# Altium footprint library CMRat_GEN2.8.PcbLib: 50 footprints (part 2 of 4)
Each footprint in its own frame and in the unit in brackets; x right, y up, seen from the top. Pads: shape width x height; smd on the part's side, far side on the other; paste and mask are expansions set on the pad; w line width, h text height; cw(c..) or ccw(c..) is an arc to the next point about the centre after c.
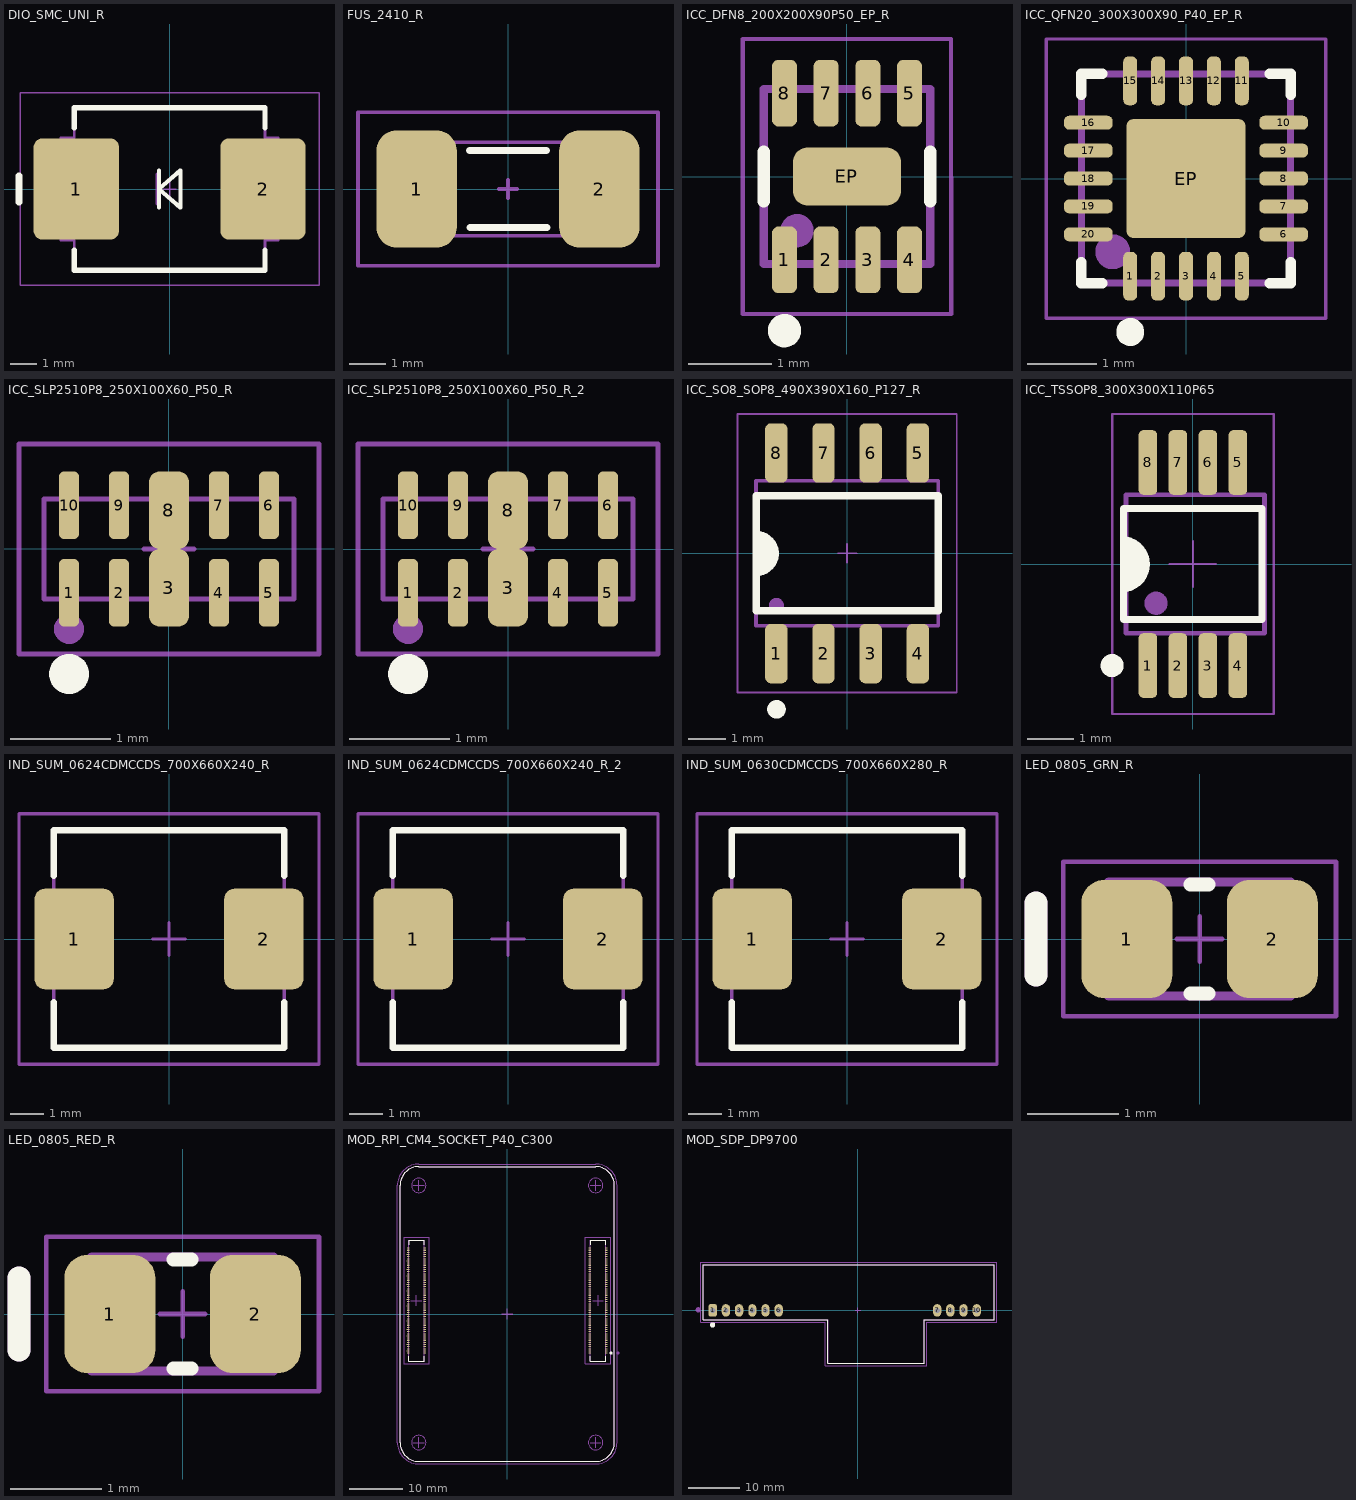
[diagram p1: the footprints below, top view; thin cyan lines are the x and y axes]

## DIO_SMC_UNI_R [mm]
pads (2):
  rrect20% 3.2x3.8 smd: 1(-3.5,0) 2(3.5,0)
Top Overlay:
  lines w0.152: -0.4,-0.7 -0.4,0.7 ; -0.4,0 0.4,0.7 0.4,-0.7 -0.4,0
  lines w0.2: -3.575,-2.3 -3.575,-3.05 3.575,-3.05 3.575,-2.3 ; -3.575,2.3 -3.575,3.05 3.575,3.05 3.575,2.3
  lines w0.25: -5.65,-0.5 -5.65,0.5
Mechanical 19:
  lines w0.1: 0.525,3.05 3.575,3.05 3.575,1.925 4.075,1.925 4.075,-0.525 4.075,-1.925 3.575,-1.925 3.575,-3.05 1.6,-3.05 ; 0.575,3.05 -3.575,3.05 -3.575,1.925 -4.075,1.925 -4.075,0.525 -4.075,-1.925 -3.575,-1.925 -3.575,-3.05 1.95,-3.05 ; -0.45,0 0.4,-0.7 0.4,0.7 -0.45,0
  lines w0.152: -0.45,-0.55 -0.45,0.55
  lines w0.25: -4.6,-0.5 -4.6,0.5
  text ".Designator" at 1.9,-1.15 h2
Mechanical 23:
  lines w0.05: -0.25,0 0.25,0 ; 0,-0.25 0,0.25 ; -5.6,-3.6 -4.35,-3.6 4.35,-3.6 5.6,-3.6 5.6,3.6 4.35,3.6 -4.35,3.6 -5.6,3.6 -5.6,-3.6
3D body "[SMC]User Library-DIOM8261X24.STEP": height 2.4, standoff 0.03, extent -4.065,-3.05 4.065,3.05

## FUS_2410_R [mm]
height 2.4
pads (2):
  rrect50% 2.2x3.2 smd: 1(-2.5,0) 2(2.5,0)
Top Overlay:
  lines w0.2: -1.05,1.05 1.05,1.05 ; -1.039,-1.05 1.061,-1.05
Mechanical 19:
  lines w0.1: -3.05,-1.275 -3.05,1.275 3.05,1.275 3.05,-1.275 -3.05,-1.275
  text ".Designator" at 1.65,0.3 h1
Mechanical 23:
  lines w0.1: -0.25,0 0.25,0 ; 0,-0.25 0,0.25 ; -4.1,-2.1 4.1,-2.1 4.1,2.1 -4.1,2.1 -4.1,-2.1
3D body "Fuse-2410.step": height 2.54, standoff 0, extent -3.05,-1.27 3.05,1.27

## ICC_DFN8_200X200X90P50_EP_R [mm]
height 0.9
pads (9):
  rrect50% 0.3x0.8 smd: 1(-0.75,-1) 2(-0.25,-1) 3(0.25,-1) 4(0.75,-1) 5(0.75,1) 6(0.25,1) 7(-0.25,1) 8(-0.75,1)
  rrect50% 1.3x0.7 smd: EP(0,0)
Top Overlay:
  circle w0.2: c-0.75,-1.85 r0.1
  lines w0.15: -1,-0.3 -1,0.3 ; 1,-0.3 1,0.3
Mechanical 19:
  circle w0.2: c-0.6,-0.65 r0.1
  lines w0.1: -1,-1.05 -1,1.05 1,1.05 1,-1.05 -1,-1.05
  text ".Designator" at -1.3,-1.25 h1.2
Mechanical 23:
  lines w0.05: -0.25,0 0.25,0 ; 0,-0.25 0,0.25 ; -1.25,-1.65 -1.25,1.65 1.25,1.65 1.25,-1.65 -1.25,-1.65
3D body "MIC2290YML_TR.stp": height 0.95, standoff 0, extent -1,-1.05 1,1.05

## ICC_QFN20_300X300X90_P40_EP_R [mm]
height 13.25
pads (21):
  rrect75% 0.2x0.7 smd: 1(-0.8,-1.4) 2(-0.4,-1.4) 3(0,-1.4) 4(0.4,-1.4) 5(0.8,-1.4) 11(0.8,1.4) 12(0.4,1.4) 13(0,1.4) 14(-0.4,1.4) 15(-0.8,1.4)
  rrect75% 0.7x0.2 smd: 6(1.4,-0.8) 7(1.4,-0.4) 8(1.4,0) 9(1.4,0.4) 10(1.4,0.8) 16(-1.4,0.8) 17(-1.4,0.4) 18(-1.4,0) 19(-1.4,-0.4) 20(-1.4,-0.8)
  rrect10% 1.7x1.7 smd paste-10: EP(0,0)
Top Overlay:
  circle w0.2: c-0.8,-2.2 r0.1
  lines w0.15: -1.5,-1.2 -1.5,-1.5 -1.2,-1.5 ; -1.5,1.2 -1.5,1.5 -1.2,1.5 ; 1.2,-1.5 1.5,-1.5 1.5,-1.2 ; 1.2,1.5 1.5,1.5 1.5,1.2
Top Paste:
  circle w0.3: c0,0 r0.125
  circle w0.3: c0.55,-0.55 r0.125
  circle w0.3: c0.55,0.55 r0.125
  circle w0.3: c-0.55,0.55 r0.125
  circle w0.3: c-0.55,-0.55 r0.125
Mechanical 19:
  circle w0.25: c-1.05,-1.05 r0.125
  lines w0.1: -1.5,-1.5 -1.5,1.5 1.5,1.5 1.5,-1.5 -1.5,-1.5
  text ".Designator" at -2,-0.9 h1
Mechanical 23:
  lines w0.05: -0.4,0 0.4,0 ; 0,-0.41 0,0.39 ; -2,-2 -2,2 2,2 2,-2 -2,-2
3D body "VQFN-20-3x3mm.step": height 0.85, standoff 0, extent -1.5,-1.5 1.5,1.5

## ICC_SLP2510P8_250X100X60_P50_R [mm]
height 4.5
pads (10):
  rrect50% 0.2x0.675 smd: 1(-1,-0.438) 2(-0.5,-0.438) 4(0.5,-0.437) 5(1,-0.437) 6(1,0.437) 7(0.5,0.437) 9(-0.5,0.437) 10(-1,0.437)
  rrect50% 0.4x0.775 smd: 3(0,-0.388) 8(0,0.387)
Top Overlay:
  circle w0.2: c-1,-1.25 r0.1
Mechanical 19:
  circle w0.15: c-1,-0.8 r0.075
  lines w0.05: -1.25,-0.5 -1.25,0.5 1.25,0.5 1.25,-0.5 -1.25,-0.5
  text ".Designator" at -1.6,-1.15 h1
Mechanical 23:
  lines w0.05: -0.25,0 0.25,0 ; 0,-0.25 0,0.25 ; -1.5,-1.05 -1.5,1.05 1.5,1.05 1.5,-1.05 -1.5,-1.05
3D body "SLP2510P8.step": height 0.56, standoff -0.03, extent -1.25,-0.505 1.25,0.505

## ICC_SLP2510P8_250X100X60_P50_R_2 [mm]
pads (10):
  rrect50% 0.2x0.675 smd: 1(-1,-0.437) 2(-0.5,-0.437) 4(0.5,-0.437) 5(1,-0.437) 6(1,0.438) 7(0.5,0.438) 9(-0.5,0.438) 10(-1,0.438)
  rrect50% 0.4x0.775 smd: 3(0,-0.387) 8(0,0.388)
Top Overlay:
  circle w0.2: c-1,-1.25 r0.1
Mechanical 19:
  circle w0.15: c-1,-0.8 r0.075
  lines w0.05: -1.25,-0.5 1.25,-0.5 1.25,0.5 -1.25,0.5 -1.25,-0.5
  text ".Designator" at 1,1.65 h1
Mechanical 23:
  lines w0.05: -0.25,0 0.25,0 ; 0,-0.25 0,0.25 ; -1.5,-1.05 1.5,-1.05 1.5,1.05 -1.5,1.05 -1.5,-1.05
3D body "SLP2510P8.step": height 0.56, standoff -0.03, extent -1.25,-0.505 1.25,0.505

## ICC_SO8_SOP8_490X390X160_P127_R [mm]
height 10.7
pads (8):
  rrect50% 0.6x1.6 smd: 1(-1.905,-2.7) 2(-0.635,-2.7) 3(0.635,-2.7) 4(1.905,-2.7) 5(1.905,2.7) 6(0.635,2.7) 7(-0.635,2.7) 8(-1.905,2.7)
Top Overlay:
  circle w0.25: c-1.9,-4.2 r0.125
  region: -2.025,-0.3 -2.025,0.29 -2.178,0.29 -2.178,-0.3
  region: -2.136,-0.456 -2.136,0.44 -2.396,0.44 -2.396,-0.456
  lines w0.2: -2.45,-1.55 2.45,-1.55 2.45,1.55 -2.45,1.55 -2.45,-1.55
  lines w0.203: -2.447,-0.513 ccw(c-2.447,-0.005) -2.447,0.503
Mechanical 19:
  circle w0.2: c-1.9,-1.4 r0.1
  lines w0.1: -2.115,-1.95 -2.115,-3 -1.695,-3 -1.695,-1.95 ; -2.115,1.95 -2.115,3 -1.695,3 -1.695,1.95 ; -0.845,-1.95 -0.845,-3 -0.425,-3 -0.425,-1.95 ; -0.845,1.95 -0.845,3 -0.425,3 -0.425,1.95 ; 0.425,-1.95 0.425,-3 0.845,-3 0.845,-1.95 ; 0.425,1.95 0.425,3 0.845,3 0.845,1.95 ; 1.695,-1.95 1.695,-3 2.115,-3 2.115,-1.95 ; 1.695,1.95 1.695,3 2.115,3 2.115,1.95 ; -2.45,-1.95 -2.45,1.95 2.45,1.95 2.45,-1.95 -2.45,-1.95
  text ".Designator" at 2,0.65 h2
Mechanical 23:
  lines w0.05: -0.25,0 0.25,0 ; 0,-0.25 0,0.25 ; -2.95,-3.75 -2.95,3.75 2.95,3.75 2.95,-3.75 -2.95,-3.75
3D body "SOIC-8-1.step": height 1.75, standoff 0, extent -2.45,-3 2.45,3

## ICC_TSSOP8_300X300X110P65 [mm] "TSOP, 8-pin, Body 3.00x3.00mm, Pitch 0.65mm"
height 1.1
pads (8):
  rrect50% 0.4x1.4 smd: 1(-0.975,-2.2) 2(-0.325,-2.2) 3(0.325,-2.2) 4(0.975,-2.2) 5(0.975,2.2) 6(0.325,2.2) 7(-0.325,2.2) 8(-0.975,2.2)
Top Overlay:
  circle w0.25: c-1.75,-2.2 r0.125
  region: -1.235,-0.442 -1.235,0.454 -1.495,0.454 -1.495,-0.442
  region: -1.12,-0.3 -1.12,0.29 -1.272,0.29 -1.272,-0.3
  lines w0.15: -1.5,-1.2 1.5,-1.2 1.5,1.2 -1.5,1.2 -1.5,-1.2
  lines w0.203: -1.45,0.494 cw(c-1.542,-0.005) -1.445,-0.504
Mechanical 19:
  circle w0.25: c-0.8,-0.85 r0.125
  lines w0.05: -1.125,-1.5 -1.125,-2.45 -0.825,-2.45 -0.825,-1.5 ; -1.125,1.5 -1.125,2.45 -0.825,2.45 -0.825,1.5 ; -0.475,-1.5 -0.475,-2.45 -0.175,-2.45 -0.175,-1.5 ; -0.475,1.5 -0.475,2.45 -0.175,2.45 -0.175,1.5 ; 0.175,-1.5 0.175,-2.45 0.475,-2.45 0.475,-1.5 ; 0.175,1.5 0.175,2.45 0.475,2.45 0.475,1.5 ; 0.825,-1.5 0.825,-2.45 1.125,-2.45 1.125,-1.5 ; 0.825,1.5 0.825,2.45 1.125,2.45 1.125,1.5
  lines w0.1: -1.45,-1.5 1.55,-1.5 1.55,1.5 -1.45,1.5 -1.45,-1.5
  text ".Designator" at -2.4,0.9 h1
Mechanical 23:
  lines w0.05: -0.5,0 0.5,0 ; 0,-0.5 0,0.5 ; -1.75,-3.25 1.75,-3.25 1.75,3.25 -1.75,3.25 -1.75,-3.25
3D body "TSOP65P490X110-8N3.step": height 1.1, standoff 0, extent -1.5,-2.45 1.5,2.45

## IND_SUM_0624CDMCCDS_700X660X240_R [mm] "Molded Inductor, 2-Leads, Body 7,00x6,60mm, IPC Medium Density"
height 2.4
pads (2):
  rrect25% 2.4x3.05 smd: 1(-2.875,0) 2(2.875,0)
Top Overlay:
  lines w0.2: -3.5,-1.925 -3.5,-3.3 3.5,-3.3 3.5,-1.925 ; -3.5,1.925 -3.5,3.3 3.5,3.3 3.5,1.925
Mechanical 19:
  lines w0.1: -3.5,-3.3 3.5,-3.3 3.5,3.3 -3.5,3.3 -3.5,-3.3
  text ".Designator" at -4.45,-2.55 h3
Mechanical 23:
  lines w0.1: -0.5,0 0.5,0 ; 0,-0.5 0,0.5 ; -4.55,-3.8 4.55,-3.8 4.55,3.8 -4.55,3.8 -4.55,-3.8
3D body "INDM7066X24N.step": height 2.4, standoff 0, extent -3.72,-3.3 3.72,3.3

## IND_SUM_0624CDMCCDS_700X660X240_R_2 [mm]
pads (2):
  rrect25% 2.4x3.05 smd: 1(-2.875,0) 2(2.875,0)
Top Overlay:
  lines w0.2: -3.5,-1.925 -3.5,-3.3 3.5,-3.3 3.5,-1.925 ; -3.5,1.925 -3.5,3.3 3.5,3.3 3.5,1.925
Mechanical 19:
  lines w0.1: -3.5,-3.3 -3.5,3.3 3.5,3.3 3.5,-3.3 -3.5,-3.3
  text ".Designator" at 0.525,-1.85 h2
Mechanical 23:
  lines w0.1: -0.5,0 0.5,0 ; 0,-0.5 0,0.5 ; -4.55,-3.8 -4.55,3.8 4.55,3.8 4.55,-3.8 -4.55,-3.8
3D body "INDM7066X24N.step": height 2.4, standoff 0, extent -3.72,-3.3 3.72,3.3

## IND_SUM_0630CDMCCDS_700X660X280_R [mm] "Molded Inductor, 2-Leads, Body 7,00x6,60mm, IPC Medium Density"
height 2.8
pads (2):
  rrect25% 2.4x3.05 smd: 1(-2.875,0) 2(2.875,0)
Top Overlay:
  lines w0.2: -3.5,-1.925 -3.5,-3.3 3.5,-3.3 3.5,-1.925 ; -3.5,1.925 -3.5,3.3 3.5,3.3 3.5,1.925
Mechanical 19:
  lines w0.1: -3.5,-3.3 3.5,-3.3 3.5,3.3 -3.5,3.3 -3.5,-3.3
  text ".Designator" at 0.5,-1.8 h2
Mechanical 23:
  lines w0.1: -0.5,0 0.5,0 ; 0,-0.5 0,0.5 ; -4.55,-3.8 4.55,-3.8 4.55,3.8 -4.55,3.8 -4.55,-3.8
3D body "0630CDMCCDS.stp": height 3, standoff 0, extent -3.5,-3.3 3.5,3.3

## LED_0805_GRN_R [mm]
pads (2):
  rrect50% 1x1.3 smd: 1(-0.8,0) 2(0.8,0)
Top Overlay:
  lines w0.15: -0.1,-0.6 0.1,-0.6 ; -0.1,0.6 0.1,0.6
  lines w0.25: -1.8,-0.4 -1.8,0.4
Mechanical 19:
  lines w0.1: -1,-0.625 1,-0.625 1,0.625 -1,0.625 -1,-0.625
  lines w0.25: -1.8,-0.4 -1.8,0.4
  text ".Designator" at 4.45,0.25 h1
Mechanical 23:
  lines w0.05: -0.25,0 0.25,0 ; 0,-0.25 0,0.25 ; -1.5,-0.85 1.5,-0.85 1.5,0.85 -1.5,0.85 -1.5,-0.85
3D body "User Library-led_0805G.stp": height 1.1, standoff 0, extent -1.01,-0.625 1.01,0.625

## LED_0805_RED_R [mm]
pads (2):
  rrect50% 1x1.3 smd: 1(-0.8,0) 2(0.8,0)
Top Overlay:
  lines w0.15: -0.1,-0.6 0.1,-0.6 ; -0.1,0.6 0.1,0.6
  lines w0.25: -1.8,-0.4 -1.8,0.4
Mechanical 19:
  lines w0.1: -1,-0.625 1,-0.625 1,0.625 -1,0.625 -1,-0.625
  lines w0.25: -1.8,-0.4 -1.8,0.4
  text ".Designator" at 4.5,0.35 h1
Mechanical 23:
  lines w0.05: -0.25,0 0.25,0 ; 0,-0.25 0,0.25 ; -1.5,-0.85 1.5,-0.85 1.5,0.85 -1.5,0.85 -1.5,-0.85
3D body "User Library-led_0805.step": height 1.1, standoff 0, extent -1.01,-0.625 1.01,0.625

## MOD_RPI_CM4_3D_C300_A1 [mm]
height 7
3D body "cm4-rev1-3_new.STEP": height 6.65, standoff 1.87, extent -20,-27.5 20,27.5

## MOD_RPI_CM4_SOCKET_P40_C300 [mm]
pads (200):
  rrect75% 0.5x0.2 smd: 1(18.5,-7.3) 2(15.42,-7.3) 3(18.5,-6.9) 4(15.42,-6.9) 5(18.5,-6.5) 6(15.42,-6.5) 7(18.5,-6.1) 8(15.42,-6.1) 9(18.5,-5.7) 10(15.42,-5.7) 11(18.5,-5.3) 12(15.42,-5.3) 13(18.5,-4.9) 14(15.42,-4.9) 15(18.5,-4.5) 16(15.42,-4.5) 17(18.5,-4.1) 18(15.42,-4.1) 19(18.5,-3.7) 20(15.42,-3.7) 21(18.5,-3.3) 22(15.42,-3.3) 23(18.5,-2.9) 24(15.42,-2.9) 25(18.5,-2.5) 26(15.42,-2.5) 27(18.5,-2.1) 28(15.42,-2.1) 29(18.5,-1.7) 30(15.42,-1.7) 31(18.5,-1.3) 32(15.42,-1.3) 33(18.5,-0.9) 34(15.42,-0.9) 35(18.5,-0.5) 36(15.42,-0.5) 37(18.5,-0.1) 38(15.42,-0.1) 39(18.5,0.3) 40(15.42,0.3) 41(18.5,0.7) 42(15.42,0.7) 43(18.5,1.1) 44(15.42,1.1) 45(18.5,1.5) 46(15.42,1.5) 47(18.5,1.9) 48(15.42,1.9) 49(18.5,2.3) 50(15.42,2.3) 51(18.5,2.7) 52(15.42,2.7) 53(18.5,3.1) 54(15.42,3.1) 55(18.5,3.5) 56(15.42,3.5) 57(18.5,3.9) 58(15.42,3.9) 59(18.5,4.3) 60(15.42,4.3) 61(18.5,4.7) 62(15.42,4.7) 63(18.5,5.1) 64(15.42,5.1) 65(18.5,5.5) 66(15.42,5.5) 67(18.5,5.9) 68(15.42,5.9) 69(18.5,6.3) 70(15.42,6.3) 71(18.5,6.7) 72(15.42,6.7) 73(18.5,7.1) 74(15.42,7.1) 75(18.5,7.5) 76(15.42,7.5) 77(18.5,7.9) 78(15.42,7.9) 79(18.5,8.3) 80(15.42,8.3) 81(18.5,8.7) 82(15.42,8.7) 83(18.5,9.1) 84(15.42,9.1) 85(18.5,9.5) 86(15.42,9.5) 87(18.5,9.9) 88(15.42,9.9) 89(18.5,10.3) 90(15.42,10.3) 91(18.5,10.7) 92(15.42,10.7) 93(18.5,11.1) 94(15.42,11.1) 95(18.5,11.5) 96(15.42,11.5) 97(18.5,11.9) 98(15.42,11.9) 99(18.5,12.3) 100(15.42,12.3) 101(-15.42,-7.3) 102(-18.5,-7.3) 103(-15.42,-6.9) 104(-18.5,-6.9) 105(-15.42,-6.5) 106(-18.5,-6.5) 107(-15.42,-6.1) 108(-18.5,-6.1) 109(-15.42,-5.7) 110(-18.5,-5.7) 111(-15.42,-5.3) 112(-18.5,-5.3) 113(-15.42,-4.9) 114(-18.5,-4.9) 115(-15.42,-4.5) 116(-18.5,-4.5) 117(-15.42,-4.1) 118(-18.5,-4.1) 119(-15.42,-3.7) 120(-18.5,-3.7) 121(-15.42,-3.3) 122(-18.5,-3.3) 123(-15.42,-2.9) 124(-18.5,-2.9) 125(-15.42,-2.5) 126(-18.5,-2.5) 127(-15.42,-2.1) 128(-18.5,-2.1) 129(-15.42,-1.7) 130(-18.5,-1.7) 131(-15.42,-1.3) 132(-18.5,-1.3) 133(-15.42,-0.9) 134(-18.5,-0.9) 135(-15.42,-0.5) 136(-18.5,-0.5) 137(-15.42,-0.1) 138(-18.5,-0.1) 139(-15.42,0.3) 140(-18.5,0.3) 141(-15.42,0.7) 142(-18.5,0.7) 143(-15.42,1.1) 144(-18.5,1.1) 145(-15.42,1.5) 146(-18.5,1.5) 147(-15.42,1.9) 148(-18.5,1.9) 149(-15.42,2.3) 150(-18.5,2.3) 151(-15.42,2.7) 152(-18.5,2.7) 153(-15.42,3.1) 154(-18.5,3.1) 155(-15.42,3.5) 156(-18.5,3.5) 157(-15.42,3.9) 158(-18.5,3.9) 159(-15.42,4.3) 160(-18.5,4.3) 161(-15.42,4.7) 162(-18.5,4.7) 163(-15.42,5.1) 164(-18.5,5.1) 165(-15.42,5.5) 166(-18.5,5.5) 167(-15.42,5.9) 168(-18.5,5.9) 169(-15.42,6.3) 170(-18.5,6.3) 171(-15.42,6.7) 172(-18.5,6.7) 173(-15.42,7.1) 174(-18.5,7.1) 175(-15.42,7.5) 176(-18.5,7.5) 177(-15.42,7.9) 178(-18.5,7.9) 179(-15.42,8.3) 180(-18.5,8.3) 181(-15.42,8.7) 182(-18.5,8.7) 183(-15.42,9.1) 184(-18.5,9.1) 185(-15.42,9.5) 186(-18.5,9.5) 187(-15.42,9.9) 188(-18.5,9.9) 189(-15.42,10.3) 190(-18.5,10.3) 191(-15.42,10.7) 192(-18.5,10.7) 193(-15.42,11.1) 194(-18.5,11.1) 195(-15.42,11.5) 196(-18.5,11.5) 197(-15.42,11.9) 198(-18.5,11.9) 199(-15.42,12.3) 200(-18.5,12.3)
Top Overlay:
  circle w0.3: c19.4,-7.3 r0.15
  lines w0.2: -18.4,-7.9 -18.4,-8.8 -15.52,-8.8 -15.52,-7.9 ; -18.4,12.9 -18.4,13.8 -15.52,13.8 -15.52,12.9 ; 15.52,-7.9 15.52,-8.8 18.4,-8.8 18.4,-7.9 ; 15.52,12.9 15.52,13.8 18.4,13.8 18.4,12.9 ; -20,-24 ccw(c-16.5,-24) -16.5,-27.5 16.5,-27.5 ccw(c16.5,-24) 20,-24 20,24 ccw(c16.5,24) 16.5,27.5 -16.5,27.5 ccw(c-16.5,24) -20,24 -20,-24
Mechanical 15:
  text ".Designator" at -5.25,5 h2
Mechanical 17:
  circle w0.1: c-16.5,24 r1.35
  circle w0.1: c-16.5,-24 r1.35
  circle w0.1: c16.5,-24 r1.35
  circle w0.1: c16.5,24 r1.35
  lines w0.1: -17.96,2.5 -16.96,2.5 ; -17.5,-24 -16.5,-24 ; -17.5,24 -16.5,24 ; -16.96,1.5 -16.96,2.5 ; -16.96,3.5 -16.96,2.5 ; -16.5,-25 -16.5,-24 ; -16.5,-23 -16.5,-24 ; -16.5,23 -16.5,24 ; -16.5,25 -16.5,24 ; -15.96,2.5 -16.96,2.5 ; -15.5,-24 -16.5,-24 ; -15.5,24 -16.5,24 ; -1,0 0,0 ; 0,-1 0,0 ; 0,1 0,0 ; 1,0 0,0 ; 15.5,-24 16.5,-24 ; 15.5,24 16.5,24 ; 15.96,2.5 16.96,2.5 ; 16.5,-25 16.5,-24 ; 16.5,-23 16.5,-24 ; 16.5,23 16.5,24 ; 16.5,25 16.5,24 ; 16.96,1.5 16.96,2.5 ; 16.96,3.5 16.96,2.5 ; 17.5,-24 16.5,-24 ; 17.5,24 16.5,24 ; 17.96,2.5 16.96,2.5
Mechanical 19:
  circle w0.3: c20.65,-7.3 r0.15
  circle w0.3: c20.65,-7.3 r0.15
  lines w0.2: 15.52,-7.9 15.52,-8.8 ; 18.4,-7.9 18.4,-8.8 ; 15.52,-8.8 15.52,13.8 18.4,13.8 18.4,-8.8 ; 15.52,-8.8 18.4,-8.8 ; 15.52,-8.8 18.4,-8.8 ; -20,-24 ccw(c-16.5,-24) -16.5,-27.5 16.5,-27.5 ccw(c16.5,-24) 20,-24 20,24 ccw(c16.5,24) 16.5,27.5 -16.5,27.5 ccw(c-16.5,24) -20,24 -20,-24 ; -18.4,-8.8 -15.52,-8.8 -15.52,13.8 -18.4,13.8 -18.4,-8.8
Mechanical 23:
  lines w0.1: -17.96,2.5 -16.96,2.5 ; -16.96,1.5 -16.96,2.5 ; -16.96,3.5 -16.96,2.5 ; -15.96,2.5 -16.96,2.5 ; 15.96,2.5 16.96,2.5 ; 16.96,1.5 16.96,2.5 ; 16.96,3.5 16.96,2.5 ; 17.96,2.5 16.96,2.5 ; -19.35,-9.3 -19.35,14.3 -14.575,14.3 -14.575,-9.3 -19.35,-9.3 ; 14.575,-9.3 14.575,14.3 19.35,14.3 19.35,-9.3 14.575,-9.3
  lines w0.2: -1,0 1,0 ; 0,-1 0,1 ; -20.5,-24 ccw(c-16.5,-24) -16.5,-28 16.5,-28 ccw(c16.5,-24) 20.5,-24 20.5,24 ccw(c16.5,24) 16.5,28 -16.5,28 ccw(c-16.5,24) -20.5,24 -20.5,-24
3D body "Hirose_DF40HC(3.0)-100DS-0.4V.stp": height 2.9, standoff 0, extent 15.26,-8.8 18.64,13.8
3D body "Hirose_DF40HC(3.0)-100DS-0.4V.stp": height 2.9, standoff 0, extent -18.64,-8.8 -15.26,13.8

## MOD_SDP_DP9700 [mm]
height 10.7
pads (10):
  rrect50% 1.6x2.4 hole 1: 1(-27.94,0)
  oval 1.6x2.4 hole 1: 2(-25.4,0) 3(-22.86,0) 6(-15.24,0) 7(15.24,0) 8(17.78,0) 9(20.32,0) 10(22.86,0)
  oval 1.55x2.4 hole 1: 4(-20.32,0)
  oval 1.5x2.4 hole 1: 5(-17.78,0)
Top Overlay:
  circle w0.5: c-27.95,-2.8 r0.25
  lines w0.2: -29.76,-1.8 -5.76,-1.8 -5.76,-10.2 12.74,-10.2 12.74,-1.8 26.24,-1.8 26.24,8.8 -29.76,8.8 -29.76,-1.8
Mechanical 21:
  circle w0.5: c-30.71,0.1 r0.25
  lines w0.1: -29.75,-1.8 -29.75,8.8 26.25,8.8 26.25,-1.8 12.74,-1.8 12.74,-10.2 -5.75,-10.2 -5.75,-1.8 -29.75,-1.8
  text ".Designator" at -12.85,7.2 h2
Mechanical 23:
  lines w0.1: -0.5,0 0.5,0 ; 0,-0.5 0,0.5 ; -30.25,-2.3 -6.25,-2.3 -6.25,-10.7 13.25,-10.7 13.25,-2.3 26.75,-2.3 26.75,9.3 -30.25,9.3 -30.25,-2.3
3D body "Ag9700.step": height 14.5, standoff -2.5, extent -29.76,-10.2 26.24,8.8